# Altium footprint library chenjd.PcbLib: 87 footprints (part 4 of 6)
Each footprint in its own frame and in the unit in brackets; x right, y up, seen from the top. Pads: shape width x height; smd on the part's side, far side on the other; paste and mask are expansions set on the pad; w line width, h text height; cw(c..) or ccw(c..) is an arc to the next point about the centre after c.
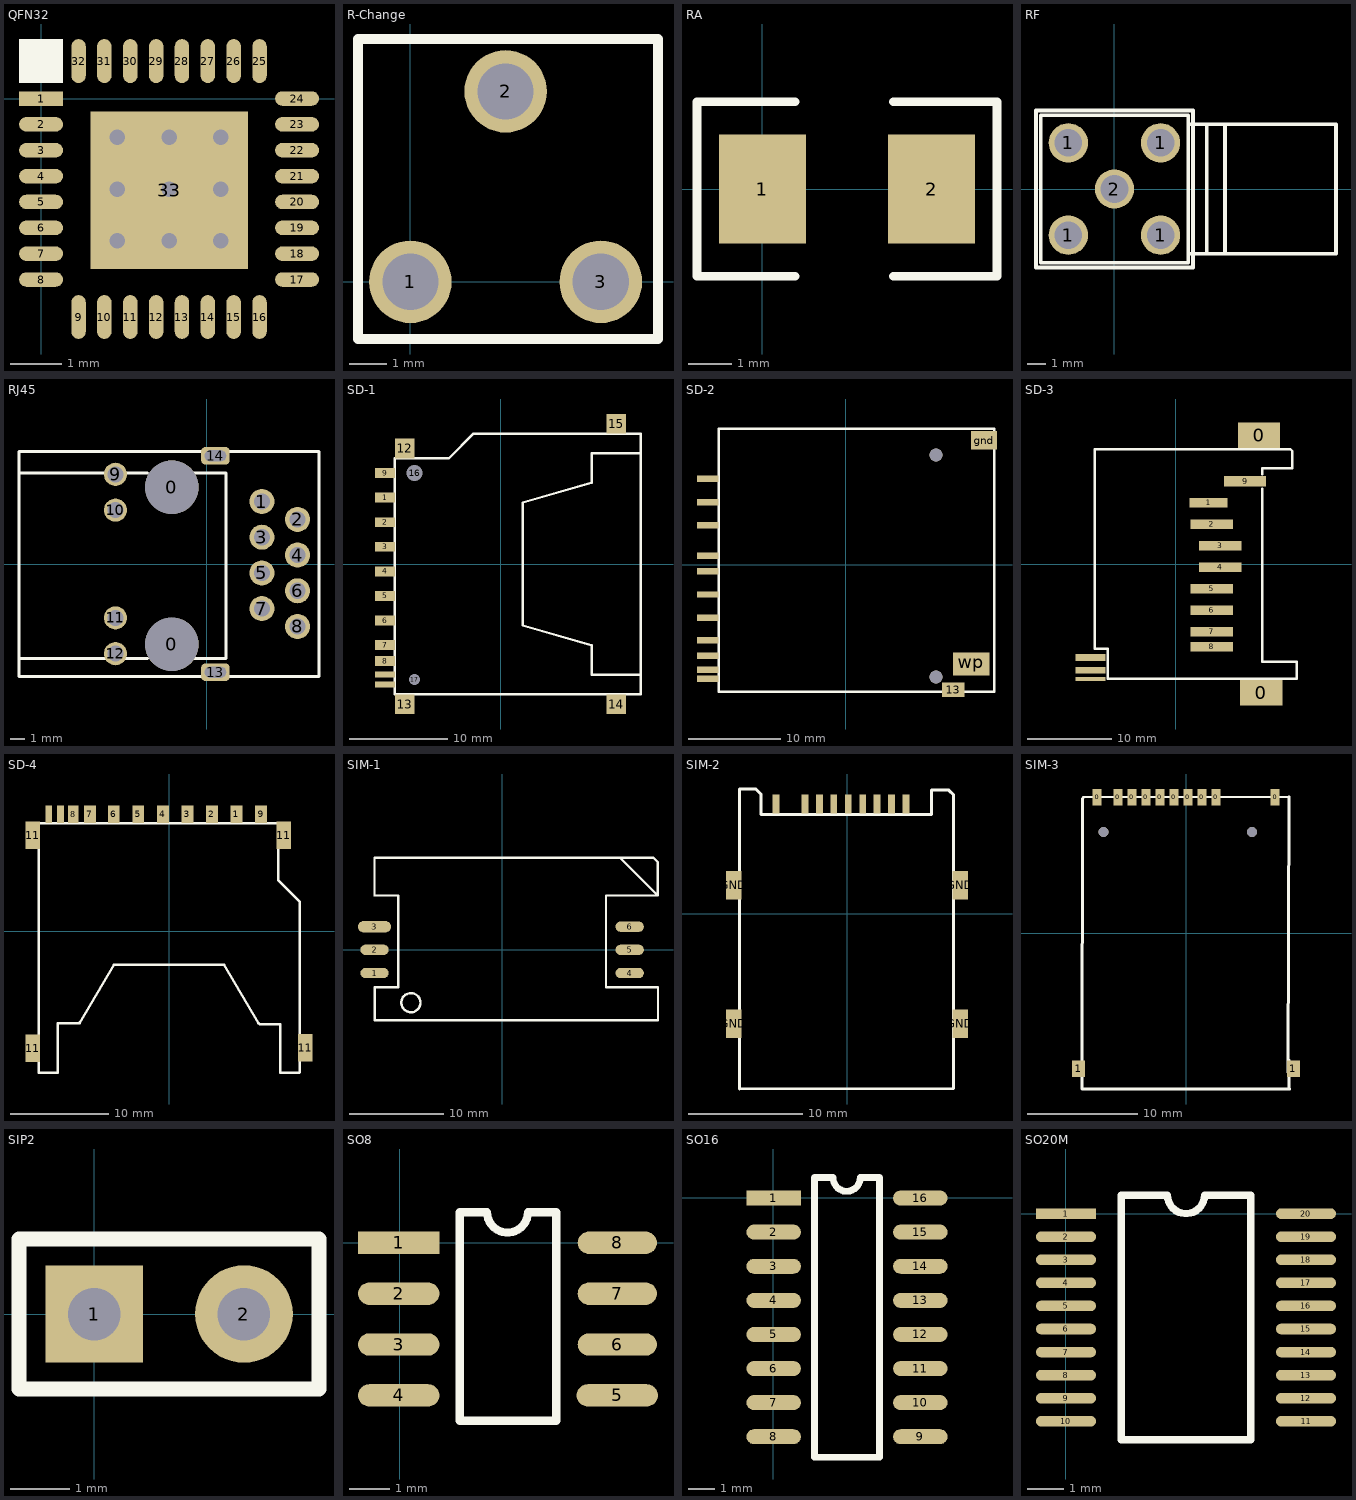
[diagram p3: the footprints below, top view; thin cyan lines are the x and y axes]

## QFN32 [mm] "QFN32脚"
pads (33):
  rect 0.85x0.28 smd: 1(0,0)
  oval 0.85x0.28 smd: 2(0,-0.5) 3(0,-1) 4(0,-1.5) 5(0,-2) 6(0,-2.5) 7(0,-3) 8(0,-3.5) 17(4.95,-3.5) 18(4.95,-3) 19(4.95,-2.5) 20(4.95,-2) 21(4.95,-1.5) 22(4.95,-1) 23(4.95,-0.5) 24(4.95,0)
  oval 0.28x0.85 smd: 9(0.725,-4.225) 10(1.225,-4.225) 11(1.725,-4.225) 12(2.225,-4.225) 13(2.725,-4.225) 14(3.225,-4.225) 15(3.725,-4.225) 16(4.225,-4.225) 25(4.225,0.725) 26(3.725,0.725) 27(3.225,0.725) 28(2.725,0.725) 29(2.225,0.725) 30(1.725,0.725) 31(1.225,0.725) 32(0.725,0.725)
  rect 3.048x3.048 smd: 33(2.479,-1.77)
via 1.475,-2.75 diameter 0.508 hole 0.3
via 1.475,-1.75 diameter 0.508 hole 0.3
via 1.475,-0.75 diameter 0.508 hole 0.3
via 3.475,-2.75 diameter 0.508 hole 0.3
via 3.475,-1.75 diameter 0.508 hole 0.3
via 3.475,-0.75 diameter 0.508 hole 0.3
via 2.475,-2.75 diameter 0.508 hole 0.3
via 2.475,-1.75 diameter 0.508 hole 0.3
via 2.475,-0.75 diameter 0.508 hole 0.3
Top Overlay:
  rectangle: -0.427,0.3 0.424,1.151

## R-Change [mm] "滑动变阻器"
pads (3):
  round 2.2 hole 1.5: 1(0,0) 2(2.54,5.08) 3(5.08,0)
Top Overlay:
  lines w0.254: -1.397,-1.524 6.604,-1.524 6.604,-1.27 6.604,6.477 -1.397,6.477 -1.397,-1.524

## RA [mil] "静电过压保护器件"
pads (2):
  rect 80x100 smd: 1(0.03,0) 2(155.03,0)
Top Overlay:
  lines w8: 30.03,-80 -59.97,-80 -59.97,80 30.03,80 ; 120.03,-80 215.03,-80 215.03,80 120.03,80
3D body "RA.STEP": height 27.95, standoff 0, extent -22.45,-47.92 182.28,50.5

## RF [mil]
height 78.74
pads (5):
  round 85 hole 60: 1(-100,-100) 1(-100,100) 1(100,100) 1(100,-100) 2(0,0)
Top Overlay:
  lines w8: 160,-140 480,-140 480,0 480,140 160,140 ; 170,140 170,170 ; 199.63,-140 199.63,140 ; 239.63,-140 239.63,140 ; 170,170 -170,170 -170,-170 170,-170 170,170 ; -160,-160 -160,160 160,160 160,-160 -160,-160

## RJ45 [mil] "RJ45"
pads (16):
  round 150 hole 150: 0(-97.08,-225) 0(-97.08,215)
  round 70 hole 45: 1(154.92,175) 2(254.92,125) 3(154.92,75) 4(254.92,25) 5(154.92,-25) 6(254.92,-75) 7(154.92,-125) 8(254.92,-175)
  round 65 hole 45: 9(-254.92,251.02) 10(-254.92,151.02) 11(-254.92,-151.02) 12(-254.92,-251.02)
  rrect50% 80x50 hole 30 slot 60 at 0 deg: 13(24.92,-303) 14(24.92,303)
Top Overlay:
  lines w8: -525.08,-265 -165.08,-265 ; -525.08,255 -165.08,255 ; -45.08,-265 54.92,-265 54.92,255 -45.08,255 ; -525.08,-315 314.92,-315 314.92,315 -525.08,315 -525.08,-315

## SD-1 [mm]
pads (17):
  rect 2x1 smd: 1(-11.75,6.75) 2(-11.75,4.25) 3(-11.75,1.75) 4(-11.75,-0.75) 5(-11.75,-3.25) 6(-11.75,-5.75) 7(-11.75,-8.25) 8(-11.75,-9.875) 9(-11.75,9.25)
  rect 2x0.6 smd: 10(-11.75,-12.25) 11(-11.75,-11.25)
  rect 2x2 smd: 12(-9.75,11.75) 13(-9.75,-14.25) 14(11.75,-14.25) 15(11.75,14.25)
  round 1.5 hole 1.6: 16(-8.75,9.25)
  round 1 hole 1.1: 17(-8.75,-11.75)
Top Overlay:
  lines w0.254: 14.25,-11.25 9.25,-11.25 9.25,-8.25 2.25,-6.25 2.25,6.25 9.25,8.25 9.25,11.25 14.25,11.25 ; -10.75,-13.25 -10.75,10.75 -5.25,10.75 -2.75,13.25 14.25,13.25 14.25,-13.25 -10.75,-13.25

## SD-2 [mm]
pads (14):
  rect 2.35x0.7 smd: 1(-14.935,6.8) 2(-14.935,4.3) 3(-14.935,1) 4(-14.935,-0.7) 5(-14.935,-3.2) 6(-14.935,-5.7) 7(-14.935,-8.13) 8(-14.935,-9.82) 9(-14.935,9.3) cd(-14.935,-11.32) com(-14.935,-12.32)
  rect 2.4x1.6 smd: 13(11.595,-13.5)
  rect 2.8x2 smd: gnd(14.935,13.5)
  rect 3.95x2.5 smd: wp(13.565,-10.7)
via 9.735,-12.1 diameter 1.4 hole 1.4
via 9.735,11.9 diameter 1.4 hole 1.4
Top Overlay:
  lines w0.254: -13.76,-13.72 -13.76,14.72 16.045,14.72 16.045,-13.72 -13.76,-13.72

## SD-3 [mm]
pads (14):
  rect 5x3 smd: 0(9.843,15.24) 0(10.097,-15.24)
  rect 4.5x1.143 smd: 1(3.874,7.239)
  rect 5x1.143 smd: 2(4.255,4.699) 3(5.271,2.159) 4(5.271,-0.381) 5(4.255,-2.921) 6(4.255,-5.461) 7(4.255,-8.001) 8(4.255,-9.779)
  rect 5x1.27 smd: 9(8.192,9.779)
  rect 3.556x0.8 smd: 10(-10.097,-11.049) 11(-10.097,-12.573)
  rect 3.556x0.5 smd: 12(-10.097,-13.589)
Top Overlay:
  lines w0.3: 7.683,-13.589 14.287,-13.589 14.287,-11.557 10.223,-11.557 10.223,8.889 ; 8.191,-13.589 -8.065,-13.589 -8.065,-10.033 -9.589,-10.033 -9.589,13.589 8.191,13.589 13.525,13.589 13.779,13.335 13.779,11.303 10.223,11.303 10.223,10.59

## SD-4 [mm]
pads (15):
  rect 1.2x1.8 smd: 1(6.858,11.917) 2(4.369,11.917) 3(1.875,11.908) 4(-0.625,11.908) 5(-3.125,11.908) 6(-5.625,11.908) 7(-8.05,11.908) 9(9.375,11.908)
  rect 1.1x1.8 smd: 8(-9.754,11.917)
  rect 0.7x1.8 smd: 10(-11.05,11.908) 12(-12.243,11.917)
  rect 1.5x2.8 smd: 11(-13.868,-11.917) 11(-13.868,9.774) 11(11.684,9.774) 11(13.868,-11.866)
Top Overlay:
  lines w0.254: -11.3,-9.383 -11.3,-14.383 -13.273,-14.383 -13.273,11.003 -13.259,11.017 11.1,11.017 11.1,5.207 13.289,3.018 13.3,3.018 13.3,-14.356 13.273,-14.383 11.3,-14.383 11.3,-9.484 9.258,-9.484 9.1,-9.326 ; -11.249,-9.377 -9.207,-9.377 -9.049,-9.219 ; -9.1,-9.377 -5.588,-3.383 ; -5.6,-3.383 5.6,-3.383 9.1,-9.377
Multi-Layer:
  circle w0.254: c9.5,8.657 r0.82
  circle w0.254: c-11.532,8.617 r0.58

## SIM-1 [mm]
pads (6):
  oval 3x1.1 smd: 1(-13.5,-2.45) 2(-13.5,0) 4(13.5,-2.45) 5(13.5,0) 6(13.5,2.45)
  oval 3.5x1.2 smd: 3(-13.5,2.45)
Top Overlay:
  circle w0.254: c-9.652,-5.588 r1.016
  lines w0.254: -13.495,-7.43 -13.495,-3.95 -11,-3.95 -11,5.735 ; -13.475,-7.45 16.5,-7.45 ; -11,5.75 -13.492,5.75 -13.5,5.758 -13.5,9.75 16.011,9.75 16.467,9.294 16.467,5.75 ; 11,-3.95 11,5.75 16.467,5.75 ; 11.005,-3.95 14.923,-3.95 ; 12.467,9.75 16.467,5.75 ; 14.542,-3.95 16.495,-3.95 16.495,-7.445

## SIM-2 [mm]
pads (13):
  rect 0.6x1.65 smd: 0(-6.25,9.662) 0(-3.7,9.662) 0(-2.43,9.662) 0(-1.16,9.662) 0(0.11,9.662) 0(1.38,9.662) 0(2.65,9.662) 0(3.92,9.662) 0(5.19,9.662)
  rect 1.35x2.5 smd: GND(-9.95,-9.662) GND(-9.95,2.538) GND(9.95,-9.662) GND(9.95,2.537)
Top Overlay:
  lines w0.254: -9.44,-15.382 -9.44,10.983 -9.186,10.983 -8.018,10.983 -7.561,10.526 -7.561,8.748 7.425,8.748 7.425,10.882 8.949,10.882 9.356,10.475 9.356,-15.331 -9.44,-15.382

## SIM-3 [mm]
pads (12):
  rect 0.8x1.5 smd: 0(-8.07,12.325) 0(-6.17,12.325) 0(-4.9,12.325) 0(-3.63,12.325) 0(-2.36,12.325) 0(-1.09,12.325) 0(0.18,12.325) 0(1.45,12.325) 0(2.72,12.325) 0(8.08,12.325)
  rect 1.2x1.5 smd: 1(-9.75,-12.325) 1(9.75,-12.325)
via -7.5,9.175 diameter 0.9 hole 0.9
via 6,9.175 diameter 0.9 hole 0.9
Top Overlay:
  lines w0.254: 7.778,12.325 9.353,12.375 ; 9.251,-12.618 9.353,12.375 ; 9.353,-11.501 9.353,-14.091 9.404,-14.142 8.642,-14.142 -9.443,-14.142 -9.392,12.223 -9.291,12.325 9.353,12.375

## SIP2 [mil] "JR口"
pads (2):
  rect 65x65 hole 35: 1(0,0)
  round 65 hole 35: 2(100,0)
Top Overlay:
  lines w10: -50,-50 -50,50 150,50 150,-50 -50,-50

## SO8 [mil] "485和RTC"
pads (8):
  rect 80x22 smd: 1(-0.88,0.16)
  oval 80x22 smd: 2(-0.88,-49.84) 3(-0.88,-99.84) 4(-0.88,-149.84) 5(214.12,-149.84)
  oval 78x22 smd: 6(214.12,-99.84) 7(214.12,-49.84) 8(214.12,0.16)
Top Overlay:
  lines w8: 59.12,-174.84 59.12,30.16 86.12,30.16 ccw(c106.12,30.16) 126.12,30.16 154.12,30.16 154.12,-174.84 59.12,-174.84
3D body "SOP8.STEP": height 74.8, standoff 0, extent -8.24,-178.42 228.25,18.43

## SO16 [mil] "232"
pads (16):
  rect 80x22 smd: 1(0.38,-0.24)
  oval 80x22 smd: 2(0.38,-50.24) 3(0.38,-100.25) 4(0.38,-150.25) 5(0.38,-200.25) 6(0.38,-250.25) 7(0.38,-300.25) 8(0.38,-350.25) 9(215.38,-350.25) 10(215.38,-300.25) 11(215.38,-250.25) 12(215.38,-200.25) 13(215.38,-150.25) 14(215.38,-100.25) 15(215.38,-50.24) 16(215.38,-0.24)
Top Overlay:
  lines w10: 60.38,-380.25 155.38,-380.25 155.38,29.75 127.38,29.75 cw(c107.38,29.75) 87.38,29.76 60.38,29.75 60.38,-380.25
3D body "SOP16.STEP": height 74.8, standoff 0, extent -8.24,-371.85 228.25,21.85

## SO20M [mil] "245"
pads (20):
  rect 65x11.5 smd: 1(0.23,0.18)
  oval 65x11.5 smd: 2(0.23,-24.82) 3(0.23,-49.82) 4(0.23,-74.82) 5(0.23,-99.82) 6(0.23,-124.82) 7(0.23,-149.82) 8(0.23,-174.82) 9(0.23,-199.82) 10(0.23,-224.82) 11(260.23,-224.82) 12(260.23,-199.82) 13(260.23,-174.82) 14(260.23,-149.82) 15(260.23,-124.82) 16(260.23,-99.82) 17(260.23,-74.82) 18(260.23,-49.82) 19(260.23,-24.82) 20(260.23,0.18)
Top Overlay:
  lines w8: 60.23,-244.82 200.23,-244.82 200.23,20.18 150.23,20.18 cw(c130.23,20.18) 110.23,20.18 60.23,20.18 60.23,-244.82
3D body "TSSOP-20.step": height 47.24, standoff 0, extent 0.08,-244.92 259.93,14.92